# Altium footprint library WR-DSUB_Female.PcbLib: 32 footprints (part 2 of 2)
Each footprint in its own frame and in the unit in brackets; x right, y up, seen from the top. Pads: shape width x height; smd on the part's side, far side on the other; paste and mask are expansions set on the pad; w line width, h text height; cw(c..) or ccw(c..) is an arc to the next point about the centre after c.
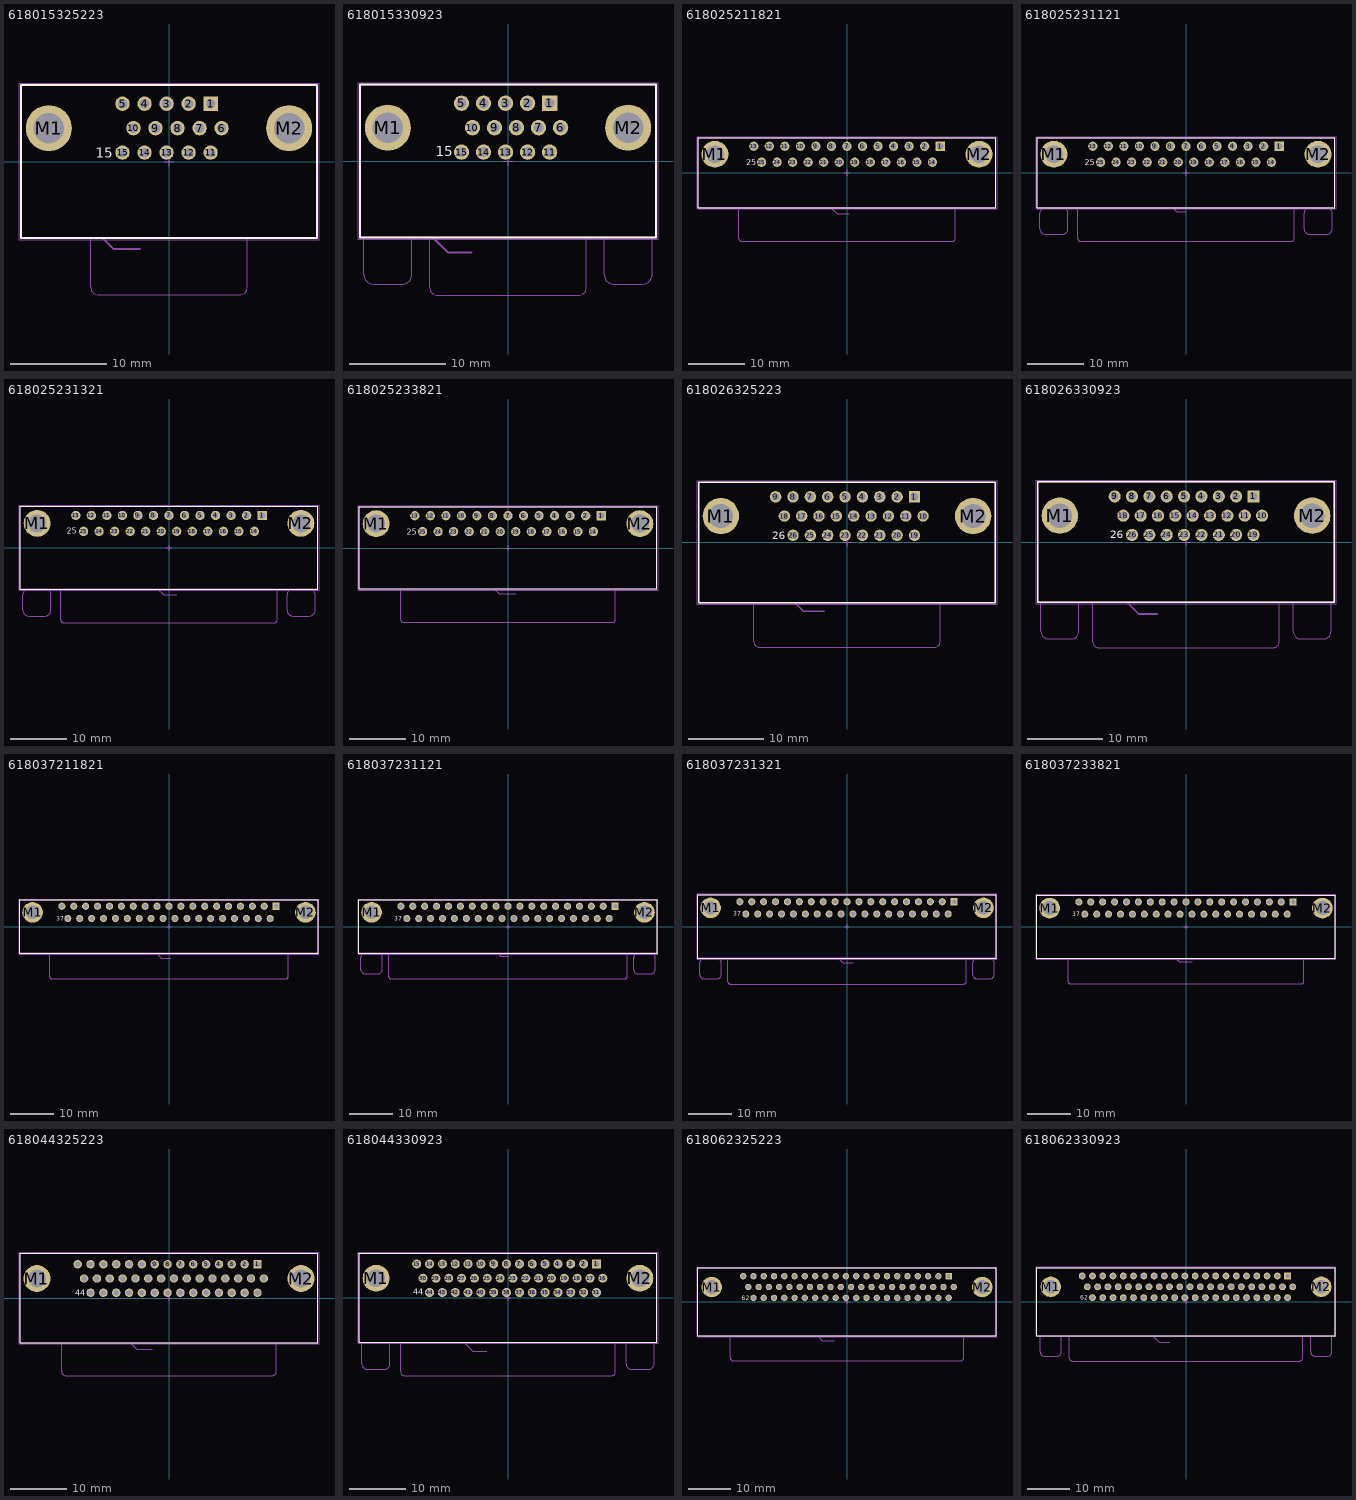
[diagram p1: the footprints below, top view; thin cyan lines are the x and y axes]

## 618015325223 [mm] "15 pins, right angled with Rivet"
height 12.5
pads (17):
  rect 1.5x1.5 hole 1: 1(4.326,6.02)
  round 1.5 hole 1: 2(2.036,6.02) 3(-0.254,6.02) 4(-2.544,6.02) 5(-4.834,6.02) 6(5.466,3.48) 7(3.176,3.48) 8(0.886,3.48) 9(-1.404,3.48) 10(-3.694,3.48) 11(4.326,0.94) 12(2.036,0.94) 13(-0.254,0.94) 14(-2.544,0.94) 15(-4.834,0.94)
  round 4.8 hole 3.2: M1(-12.495,3.48) M2(12.495,3.48)
Top Overlay:
  lines w0.2: -15.4,-7.95 -15.4,7.95 15.4,7.95 15.4,-7.95 -15.4,-7.95
  text "15" at -7.6,0.4 h1.02
Mechanical 2:
  lines w0.2: -15.4,-7.95 15.4,-7.95 ; -6.9,-7.95 -5.75,-9.1 -3,-9.1
  text "PCB Edge" at -2.6,-9.6 h1.02
Mechanical 13:
  lines w0.1: -8.15,-7.95 -8.15,-13.05 ccw(c-7.35,-13.05) -7.35,-13.85 7.35,-13.85 ccw(c7.35,-13.05) 8.15,-13.05 8.15,-7.95 ; -15.4,-7.95 15.4,-7.95 15.4,7.95 -15.4,7.95 -15.4,-7.95
Mechanical 15:
  lines w0.05: -0.5,0 0.5,0 ; 0,-0.5 0,0.5 ; -15.6,-8.15 15.6,-8.15 15.6,8.15 -15.6,8.15 -15.6,-8.15
3D body "618015325223.stp": height 12.55, standoff -3.9, extent -15.402,-13.85 15.402,7.95

## 618015330923 [mm] "15 pins, right angled"
height 12.5
pads (17):
  rect 1.6x1.6 hole 1.05: 1(4.326,6.02)
  round 1.6 hole 1.05: 2(2.036,6.02) 3(-0.254,6.02) 4(-2.544,6.02) 5(-4.834,6.02) 6(5.466,3.48) 7(3.176,3.48) 8(0.886,3.48) 9(-1.404,3.48) 10(-3.694,3.48) 11(4.326,0.94) 12(2.036,0.94) 13(-0.254,0.94) 14(-2.544,0.94) 15(-4.834,0.94)
  round 4.8 hole 3.2: M1(-12.495,3.48) M2(12.495,3.48)
Top Overlay:
  lines w0.2: -15.4,-7.95 -15.4,7.95 15.4,7.95 15.4,-7.95 -15.4,-7.95
  text "15" at -7.5,0.5 h1.02
Mechanical 2:
  lines w0.2: -15.4,-7.95 15.4,-7.95 ; -7.8,-7.95 -6.25,-9.5 -3.8,-9.5
  text "PCB Edge" at -3.4,-10.02 h1.02
Mechanical 13:
  lines w0.1: -15,-7.95 -15,-11.79 ccw(c-14,-11.79) -14,-12.79 -11,-12.79 ccw(c-11,-11.79) -10,-11.79 -10,-7.95 ; -8.15,-7.95 -8.15,-13.15 ccw(c-7.35,-13.15) -7.35,-13.95 7.35,-13.95 ccw(c7.35,-13.15) 8.15,-13.15 8.15,-7.95 ; 10,-7.95 10,-11.79 ccw(c11,-11.79) 11,-12.79 14,-12.79 ccw(c14,-11.79) 15,-11.79 15,-7.95 ; -15.4,-7.95 15.4,-7.95 15.4,7.95 -15.4,7.95 -15.4,-7.95
Mechanical 15:
  lines w0.05: -0.5,0 0.5,0 ; 0,-0.5 0,0.5 ; -15.6,-8.15 -15.6,8.15 15.6,8.15 15.6,-8.15 -15.6,-8.15
3D body "618015330923.stp": height 12.55, standoff -3.95, extent -15.402,-13.95 15.402,7.95

## 618025211821 [mm] "25p 8.08mm bracket, board lock & UNC4-40 Rivet without hex screw"
height 12.5
pads (27):
  rect 1.65x1.65 hole 1.09: 1(16.62,4.72)
  round 1.65 hole 1.09: 2(13.85,4.72) 3(11.08,4.72) 4(8.31,4.72) 5(5.54,4.72) 6(2.77,4.72) 7(0,4.72) 8(-2.77,4.72) 9(-5.54,4.72) 10(-8.31,4.72) 11(-11.08,4.72) 12(-13.85,4.72) 13(-16.62,4.72) 14(15.235,1.88) 15(12.465,1.88) 16(9.695,1.88) 17(6.925,1.88) 18(4.155,1.88) 19(1.385,1.88) 20(-1.385,1.88) 21(-4.155,1.88) 22(-6.925,1.88) 23(-9.695,1.88) 24(-12.465,1.88) 25(-15.235,1.88)
  round 4.8 hole 3.2: M1(-23.55,3.3) M2(23.55,3.3)
Top Overlay:
  lines w0.2: -26.55,-6.2 -26.55,6.2 26.55,6.2 26.55,-6.2 -26.55,-6.2
  text "25" at -17.925,1.35 h1.02
Mechanical 2:
  lines w0.2: -26.55,-6.12 26.55,-6.12 ; -3,-6.12 -1.77,-7.35 0.4,-7.35
  text "PCB Edge" at 0.7,-8.05 h1.02
Mechanical 13:
  lines w0.1: -19.3,-6.2 -19.3,-11.7 ccw(c-18.8,-11.7) -18.8,-12.2 ; -18.85,-12.2 18.8,-12.2 ccw(c18.8,-11.7) 19.3,-11.7 19.3,-6.2 ; -26.55,-6.2 26.55,-6.2 26.55,6.2 -26.55,6.2 -26.55,-6.2
Mechanical 15:
  lines w0.05: -0.5,0 0.5,0 ; 0,-0.5 0,0.5 ; -26.75,-6.4 26.75,-6.4 26.75,6.4 -26.75,6.4 -26.75,-6.4
3D body "618025211821.stp": height 12.55, standoff -3.95, extent -26.55,-12.2 26.55,6.2

## 618025231121 [mm] "25 pins, right angled, 8.08mm, with hex screw"
height 12.5
pads (27):
  rect 1.65x1.65 hole 1.09: 1(16.62,4.72)
  round 1.65 hole 1.09: 2(13.85,4.72) 3(11.08,4.72) 4(8.31,4.72) 5(5.54,4.72) 6(2.77,4.72) 7(0,4.72) 8(-2.77,4.72) 9(-5.54,4.72) 10(-8.31,4.72) 11(-11.08,4.72) 12(-13.85,4.72) 13(-16.62,4.72) 14(15.235,1.88) 15(12.465,1.88) 16(9.695,1.88) 17(6.925,1.88) 18(4.155,1.88) 19(1.385,1.88) 20(-1.385,1.88) 21(-4.155,1.88) 22(-6.925,1.88) 23(-9.695,1.88) 24(-12.465,1.88) 25(-15.235,1.88)
  round 4.8 hole 3.2: M1(-23.55,3.3) M2(23.55,3.3)
Top Overlay:
  lines w0.2: -26.55,-6.2 26.55,-6.2 26.55,6.2 -26.55,6.2 -26.55,-6.2
  text "25" at -18.1,1.35 h1.02
Mechanical 2:
  lines w0.2: -26.55,-6.12 26.55,-6.12 ; -2.5,-6.12 -1.67,-6.95 0,-6.95
  text "PCB Edge" at 0.4,-7.55 h1.02
Mechanical 13:
  lines w0.1: -25.05,-6.2 ccw(c-25.05,-7.2) -26.05,-7.2 -26.05,-10 ccw(c-25.05,-10) -25.05,-11 -22.05,-11 ccw(c-22.05,-10) -21.05,-10 -21.05,-7.2 ccw(c-22.05,-7.2) -22.05,-6.2 ; -19.3,-6.2 -19.3,-11.7 ccw(c-18.8,-11.7) -18.8,-12.2 18.8,-12.2 ccw(c18.8,-11.7) 19.3,-11.7 19.3,-6.2 ; 22.05,-6.2 ccw(c22.05,-7.2) 21.05,-7.2 21.05,-10 ccw(c22.05,-10) 22.05,-11 25.05,-11 ccw(c25.05,-10) 26.05,-10 26.05,-7.2 ccw(c25.05,-7.2) 25.05,-6.2 ; -26.55,-6.2 26.55,-6.2 26.55,6.2 -26.55,6.2 -26.55,-6.2 ; 10.5,-12.2 10.5,-12.2
Mechanical 15:
  lines w0.05: -0.5,0 0.5,0 ; 0,-0.5 0,0.5 ; -26.75,-6.4 -26.75,6.4 26.75,6.4 26.75,-6.4 -26.75,-6.4
3D body "618025231121.stp": height 12.55, standoff -3.95, extent -26.55,-12.2 26.55,6.2

## 618025231321 [mm] "25 pins, right angled, 10.3mm, with hex screw"
height 12.5
pads (27):
  rect 1.65x1.65 hole 1.09: 1(16.62,5.78)
  round 1.65 hole 1.09: 2(13.85,5.78) 3(11.08,5.78) 4(8.31,5.78) 5(5.54,5.78) 6(2.77,5.78) 7(0,5.78) 8(-2.77,5.78) 9(-5.54,5.78) 10(-8.31,5.78) 11(-11.08,5.78) 12(-13.85,5.78) 13(-16.62,5.78) 14(15.235,2.94) 15(12.465,2.94) 16(9.695,2.94) 17(6.925,2.94) 18(4.155,2.94) 19(1.385,2.94) 20(-1.385,2.94) 21(-4.155,2.94) 22(-6.925,2.94) 23(-9.695,2.94) 24(-12.465,2.94) 25(-15.235,2.94)
  round 4.8 hole 3.2: M1(-23.52,4.36) M2(23.52,4.36)
Top Overlay:
  lines w0.2: -26.55,-7.36 -26.55,7.37 26.55,7.37 26.55,-7.36 -26.55,-7.36
  text "25" at -18.2,2.5 h1.02
Mechanical 2:
  lines w0.2: -26.55,-7.26 26.55,-7.26 ; -2.1,-7.26 -0.96,-8.4 1.4,-8.4
  text "PCB Edge" at 1.8,-8.8 h1.02
Mechanical 13:
  lines w0.1: -25.05,-7.36 ccw(c-25.05,-8.36) -26.05,-8.36 -26.05,-11.16 ccw(c-25.05,-11.16) -25.05,-12.16 -22.05,-12.16 ccw(c-22.05,-11.16) -21.05,-11.16 -21.05,-8.36 ccw(c-22.05,-8.36) -22.05,-7.36 ; -19.3,-7.36 -19.3,-12.86 ccw(c-18.8,-12.86) -18.8,-13.36 18.8,-13.36 ; 19.3,-7.36 19.3,-12.86 cw(c18.8,-12.86) 18.8,-13.36 ; 22.05,-7.36 ccw(c22.05,-8.36) 21.05,-8.36 21.05,-11.16 ccw(c22.05,-11.16) 22.05,-12.16 25.05,-12.16 ccw(c25.05,-11.16) 26.05,-11.16 26.05,-8.36 ccw(c25.05,-8.36) 25.05,-7.36 ; 18.8,-13.36 18.8,-13.36 ; -26.55,-7.36 26.55,-7.36 26.55,7.37 -26.55,7.37 -26.55,-7.36
Mechanical 15:
  lines w0.05: -0.5,0 0.5,0 ; 0,-0.5 0,0.5 ; -26.75,-7.59 26.75,-7.59 26.75,7.59 -26.75,7.59 -26.75,-7.59
3D body "618025231321.stp": height 12.57, standoff -3.77, extent -26.535,-13.26 26.535,7.39

## 618025233821 [mm] "25p 10.3mm bracket, board lock & UNC4-40 Rivet without hex screw"
height 12.5
pads (27):
  rect 1.65x1.65 hole 1.09: 1(16.62,5.765)
  round 1.65 hole 1.09: 2(13.85,5.765) 3(11.08,5.765) 4(8.31,5.765) 5(5.54,5.765) 6(2.77,5.765) 7(0,5.765) 8(-2.77,5.765) 9(-5.54,5.765) 10(-8.31,5.765) 11(-11.08,5.765) 12(-13.85,5.765) 13(-16.62,5.765) 14(15.235,2.925) 15(12.465,2.925) 16(9.695,2.925) 17(6.925,2.925) 18(4.155,2.925) 19(1.385,2.925) 20(-1.385,2.925) 21(-4.155,2.925) 22(-6.925,2.925) 23(-9.695,2.925) 24(-12.465,2.925) 25(-15.235,2.925)
  round 4.8 hole 3.2: M1(-23.52,4.345) M2(23.52,4.345)
Top Overlay:
  lines w0.2: -26.55,-7.275 26.55,-7.275 26.55,7.375 -26.55,7.375 -26.55,-7.275
  text "25" at -18.1,2.4 h1.02
Mechanical 2:
  lines w0.2: -26.55,-7.275 26.55,-7.275 ; -2.5,-7.275 -1.575,-8.2 1.4,-8.2
  text "PCB Edge" at 1.8,-8.7 h1.02
Mechanical 13:
  lines w0.1: -19.15,-7.275 -19.15,-12.775 ccw(c-18.65,-12.775) -18.65,-13.275 18.65,-13.275 ; 19.15,-7.275 19.15,-12.775 cw(c18.65,-12.775) 18.65,-13.275 ; 18.65,-13.275 18.65,-13.275 ; -26.55,-7.275 -26.55,7.375 26.55,7.375 26.55,-7.275 -26.55,-7.275
Mechanical 15:
  lines w0.05: -0.5,0 0.5,0 ; 0,-0.5 0,0.5 ; -26.75,-7.575 -26.75,7.575 26.75,7.575 26.75,-7.575 -26.75,-7.575
3D body "618025233821.stp": height 12.57, standoff -3.77, extent -26.535,-13.275 26.535,7.375

## 618026325223 [mm] "26 pins, right angled with Rivet"
height 12.5
pads (28):
  rect 1.5x1.5 hole 1: 1(8.906,6.02)
  round 1.5 hole 1: 2(6.616,6.02) 3(4.326,6.02) 4(2.036,6.02) 5(-0.254,6.02) 6(-2.544,6.02) 7(-4.834,6.02) 8(-7.124,6.02) 9(-9.414,6.02) 10(10.046,3.48) 11(7.756,3.48) 12(5.466,3.48) 13(3.176,3.48) 14(0.886,3.48) 15(-1.404,3.48) 16(-3.694,3.48) 17(-5.984,3.48) 18(-8.274,3.48) 19(8.906,0.94) 20(6.616,0.94) 21(4.326,0.94) 22(2.036,0.94) 23(-0.254,0.94) 24(-2.544,0.94) 25(-4.834,0.94) 26(-7.124,0.94)
  round 4.8 hole 3.2: M1(-16.65,3.48) M2(16.65,3.48)
Top Overlay:
  lines w0.2: -19.6,-7.95 19.6,-7.95 19.6,7.95 -19.6,7.95 -19.6,-7.95
  text "26" at -9.89,0.4 h1.02
Mechanical 2:
  lines w0.2: -19.6,-7.95 19.6,-7.95 ; -6.9,-7.95 -5.75,-9.1 -3,-9.1
  text "PCB Edge" at -2.6,-9.6 h1.02
Mechanical 13:
  lines w0.1: -12.3,-7.95 -12.3,-13.05 ccw(c-11.5,-13.05) -11.5,-13.85 11.5,-13.85 ccw(c11.5,-13.05) 12.3,-13.05 12.3,-7.95 ; -19.6,-7.95 -19.6,7.95 19.6,7.95 19.6,-7.95 -19.6,-7.95
Mechanical 15:
  lines w0.05: -0.5,0 0.5,0 ; 0,-0.5 0,0.5 ; -19.8,-8.15 -19.8,8.15 19.8,8.15 19.8,-8.15 -19.8,-8.15
3D body "618026325223.stp": height 12.55, standoff -3.9, extent -19.598,-13.85 19.613,7.95

## 618026330923 [mm] "26 pins, right angled"
height 12.5
pads (28):
  rect 1.6x1.6 hole 1.05: 1(8.906,6.02)
  round 1.6 hole 1.05: 2(6.616,6.02) 3(4.326,6.02) 4(2.036,6.02) 5(-0.254,6.02) 6(-2.544,6.02) 7(-4.834,6.02) 8(-7.124,6.02) 9(-9.414,6.02) 10(10.046,3.48) 11(7.756,3.48) 12(5.466,3.48) 13(3.176,3.48) 14(0.886,3.48) 15(-1.404,3.48) 16(-3.694,3.48) 17(-5.984,3.48) 18(-8.274,3.48) 19(8.906,0.94) 20(6.616,0.94) 21(4.326,0.94) 22(2.036,0.94) 23(-0.254,0.94) 24(-2.544,0.94) 25(-4.834,0.94) 26(-7.124,0.94)
  round 4.8 hole 3.2: M1(-16.66,3.48) M2(16.66,3.48)
Top Overlay:
  lines w0.2: -19.6,-7.95 19.6,-7.95 19.6,7.95 -19.6,7.95 -19.6,-7.95
  text "26" at -10,0.5 h1.02
Mechanical 2:
  lines w0.2: -19.6,-7.95 19.6,-7.95 ; -7.8,-7.95 -6.25,-9.5 -3.8,-9.5
  text "PCB Edge" at -3.4,-10.02 h1.02
Mechanical 13:
  lines w0.1: -19.15,-7.95 -19.15,-11.79 ccw(c-18.15,-11.79) -18.15,-12.79 -15.15,-12.79 ccw(c-15.15,-11.79) -14.15,-11.79 -14.15,-7.95 ; -12.3,-7.95 -12.3,-13.15 ccw(c-11.5,-13.15) -11.5,-13.95 11.5,-13.95 ccw(c11.5,-13.15) 12.3,-13.15 12.3,-7.95 ; 14.15,-7.95 14.15,-11.79 ccw(c15.15,-11.79) 15.15,-12.79 18.15,-12.79 ccw(c18.15,-11.79) 19.15,-11.79 19.15,-7.95 ; -19.6,-7.95 -19.6,7.95 19.6,7.95 19.6,-7.95 -19.6,-7.95
Mechanical 15:
  lines w0.05: -0.5,0 0.5,0 ; 0,-0.5 0,0.5 ; -19.8,-8.15 -19.8,8.15 19.8,8.15 19.8,-8.15 -19.8,-8.15
3D body "618026330923.stp": height 12.55, standoff -3.9, extent -19.605,-13.85 19.605,7.95

## 618037211821 [mm] "37p 8.08mm bracket, board lock & UNC4-40 Rivet without hex screw"
height 12.5
pads (39):
  rect 1.65x1.65 hole 1.09: 1(24.93,4.72)
  round 1.65 hole 1.09: 2(22.16,4.72) 3(19.39,4.72) 4(16.62,4.72) 5(13.85,4.72) 6(11.08,4.72) 7(8.31,4.72) 8(5.54,4.72) 9(2.77,4.72) 10(0,4.72) 11(-2.77,4.72) 12(-5.54,4.72) 13(-8.31,4.72) 14(-11.08,4.72) 15(-13.85,4.72) 16(-16.62,4.72) 17(-19.39,4.72) 18(-22.16,4.72) 19(-24.93,4.72) 20(23.545,1.88) 21(20.775,1.88) 22(18.005,1.88) 23(15.235,1.88) 24(12.465,1.88) 25(9.695,1.88) 26(6.925,1.88) 27(4.155,1.88) 28(1.385,1.88) 29(-1.385,1.88) 30(-4.155,1.88) 31(-6.925,1.88) 32(-9.695,1.88) 33(-12.465,1.88) 34(-15.235,1.88) 35(-18.005,1.88) 36(-20.775,1.88) 37(-23.545,1.88)
  round 4.8 hole 3.2: M1(-31.75,3.3) M2(31.75,3.3)
Top Overlay:
  lines w0.2: -34.7,-6.2 -34.7,6.2 34.7,6.2 34.7,-6.2 -34.7,-6.2
  text "37" at -26.235,1.35 h1.02
Mechanical 2:
  lines w0.2: -34.7,-6.12 34.7,-6.12 ; -3,-6.12 -1.77,-7.35 0.4,-7.35
  text "PCB Edge" at 0.7,-8.05 h1.02
Mechanical 13:
  lines w0.1: -27.7,-6.2 -27.7,-11.7 ccw(c-27.2,-11.7) -27.2,-12.2 ; -27.25,-12.2 27.2,-12.2 ccw(c27.2,-11.7) 27.7,-11.7 27.7,-6.2 ; -34.7,-6.2 34.7,-6.2 34.7,6.2 -34.7,6.2 -34.7,-6.2
Mechanical 15:
  lines w0.05: -0.5,0 0.5,0 ; 0,-0.5 0,0.5 ; -34.9,-6.4 -34.9,6.4 34.9,6.4 34.9,-6.4 -34.9,-6.4
3D body "618037211821.stp": height 12.55, standoff -3.95, extent -34.7,-12.2 34.7,6.2

## 618037231121 [mm] "37 pins, right angled, 8.08mm, with hex screw"
height 12.5
pads (39):
  rect 1.65x1.65 hole 1.09: 1(24.93,4.72)
  round 1.65 hole 1.09: 2(22.16,4.72) 3(19.39,4.72) 4(16.62,4.72) 5(13.85,4.72) 6(11.08,4.72) 7(8.31,4.72) 8(5.54,4.72) 9(2.77,4.72) 10(0,4.72) 11(-2.77,4.72) 12(-5.54,4.72) 13(-8.31,4.72) 14(-11.08,4.72) 15(-13.85,4.72) 16(-16.62,4.72) 17(-19.39,4.72) 18(-22.16,4.72) 19(-24.93,4.72) 20(23.545,1.88) 21(20.775,1.88) 22(18.005,1.88) 23(15.235,1.88) 24(12.465,1.88) 25(9.695,1.88) 26(6.925,1.88) 27(4.155,1.88) 28(1.385,1.88) 29(-1.385,1.88) 30(-4.155,1.88) 31(-6.925,1.88) 32(-9.695,1.88) 33(-12.465,1.88) 34(-15.235,1.88) 35(-18.005,1.88) 36(-20.775,1.88) 37(-23.545,1.88)
  round 4.8 hole 3.2: M1(-31.75,3.3) M2(31.75,3.3)
Top Overlay:
  lines w0.2: -34.7,-6.2 -34.7,6.2 34.7,6.2 34.7,-6.2 -34.7,-6.2
  text "37" at -26.41,1.35 h1.02
Mechanical 2:
  lines w0.2: -34.7,-6.12 34.7,-6.12 ; -2.5,-6.12 -1.67,-6.95 0,-6.95
  text "PCB Edge" at 0.4,-7.55 h1.02
Mechanical 13:
  lines w0.1: -33.25,-6.2 ccw(c-33.25,-7.2) -34.25,-7.2 -34.25,-10 ccw(c-33.25,-10) -33.25,-11 -30.25,-11 ccw(c-30.25,-10) -29.25,-10 -29.25,-7.2 ccw(c-30.25,-7.2) -30.25,-6.2 ; -27.7,-6.2 -27.7,-11.7 ccw(c-27.2,-11.7) -27.2,-12.2 27.2,-12.2 ccw(c27.2,-11.7) 27.7,-11.7 27.7,-6.2 ; 30.25,-6.2 ccw(c30.25,-7.2) 29.25,-7.2 29.25,-10 ccw(c30.25,-10) 30.25,-11 33.25,-11 ccw(c33.25,-10) 34.25,-10 34.25,-7.2 ccw(c33.25,-7.2) 33.25,-6.2 ; -34.7,-6.2 -34.7,6.25 34.7,6.25 34.7,-6.2 -34.7,-6.2 ; 18.81,-12.2 18.81,-12.2
Mechanical 15:
  lines w0.05: -0.5,0 0.5,0 ; 0,-0.5 0,0.5 ; -34.9,-6.4 34.9,-6.4 34.9,6.4 -34.9,6.4 -34.9,-6.4
3D body "618037231121.stp": height 12.55, standoff -3.95, extent -34.7,-12.15 34.7,6.25

## 618037231321 [mm] "37 pins, right angled, 10.3mm, with hex screw"
height 12.5
pads (39):
  rect 1.65x1.65 hole 1.09: 1(24.93,5.78)
  round 1.65 hole 1.09: 2(22.16,5.78) 3(19.39,5.78) 4(16.62,5.78) 5(13.85,5.78) 6(11.08,5.78) 7(8.31,5.78) 8(5.54,5.78) 9(2.77,5.78) 10(0,5.78) 11(-2.77,5.78) 12(-5.54,5.78) 13(-8.31,5.78) 14(-11.08,5.78) 15(-13.85,5.78) 16(-16.62,5.78) 17(-19.39,5.78) 18(-22.16,5.78) 19(-24.93,5.78) 20(23.545,2.94) 21(20.775,2.94) 22(18.005,2.94) 23(15.235,2.94) 24(12.465,2.94) 25(9.695,2.94) 26(6.925,2.94) 27(4.155,2.94) 28(1.385,2.94) 29(-1.385,2.94) 30(-4.155,2.94) 31(-6.925,2.94) 32(-9.695,2.94) 33(-12.465,2.94) 34(-15.235,2.94) 35(-18.005,2.94) 36(-20.775,2.94) 37(-23.545,2.94)
  round 4.8 hole 3.2: M1(-31.75,4.36) M2(31.75,4.36)
Top Overlay:
  lines w0.2: -34.7,-7.36 -34.7,7.37 34.7,7.37 34.7,-7.36 -34.7,-7.36
  text "37" at -26.51,2.5 h1.02
Mechanical 2:
  lines w0.2: -34.7,-7.26 34.7,-7.26 ; -2.1,-7.26 -0.96,-8.4 1.4,-8.4
  text "PCB Edge" at 1.8,-8.8 h1.02
Mechanical 13:
  lines w0.1: -33.25,-7.36 ccw(c-33.25,-8.36) -34.25,-8.36 -34.25,-11.16 ccw(c-33.25,-11.16) -33.25,-12.16 -30.25,-12.16 ccw(c-30.25,-11.16) -29.25,-11.16 -29.25,-8.36 ccw(c-30.25,-8.36) -30.25,-7.36 ; -27.7,-7.36 -27.7,-12.86 ccw(c-27.2,-12.86) -27.2,-13.36 27.2,-13.36 ; 27.7,-7.36 27.7,-12.86 cw(c27.2,-12.86) 27.2,-13.36 ; 30.25,-7.36 ccw(c30.25,-8.36) 29.25,-8.36 29.25,-11.16 ccw(c30.25,-11.16) 30.25,-12.16 33.25,-12.16 ccw(c33.25,-11.16) 34.25,-11.16 34.25,-8.36 ccw(c33.25,-8.36) 33.25,-7.36 ; 27.2,-13.36 27.2,-13.36 ; -34.7,-7.36 34.7,-7.36 34.7,7.37 -34.7,7.37 -34.7,-7.36
Mechanical 15:
  lines w0.05: -0.5,0 0.5,0 ; 0,-0.5 0,0.5 ; -34.9,-7.59 34.9,-7.59 34.9,7.59 -34.9,7.59 -34.9,-7.59
3D body "618037231321.stp": height 12.57, standoff -3.77, extent -34.66,-13.28 34.66,7.37

## 618037233821 [mm] "37p 10.3mm bracket, board lock & UNC4-40 Rivet without hex screw"
height 12.5
pads (39):
  rect 1.65x1.65 hole 1.09: 1(24.93,5.765)
  round 1.65 hole 1.09: 2(22.16,5.765) 3(19.39,5.765) 4(16.62,5.765) 5(13.85,5.765) 6(11.08,5.765) 7(8.31,5.765) 8(5.54,5.765) 9(2.77,5.765) 10(0,5.765) 11(-2.77,5.765) 12(-5.54,5.765) 13(-8.31,5.765) 14(-11.08,5.765) 15(-13.85,5.765) 16(-16.62,5.765) 17(-19.39,5.765) 18(-22.16,5.765) 19(-24.93,5.765) 20(23.545,2.925) 21(20.775,2.925) 22(18.005,2.925) 23(15.235,2.925) 24(12.465,2.925) 25(9.695,2.925) 26(6.925,2.925) 27(4.155,2.925) 28(1.385,2.925) 29(-1.385,2.925) 30(-4.155,2.925) 31(-6.925,2.925) 32(-9.695,2.925) 33(-12.465,2.925) 34(-15.235,2.925) 35(-18.005,2.925) 36(-20.775,2.925) 37(-23.545,2.925)
  round 4.8 hole 3.2: M1(-31.75,4.345) M2(31.75,4.345)
Top Overlay:
  lines w0.2: -34.7,-7.275 -34.7,7.375 34.7,7.375 34.7,-7.275 -34.7,-7.275
  text "37" at -26.41,2.4 h1.02
Mechanical 2:
  lines w0.2: -34.7,-7.275 34.7,-7.275 ; -2.5,-7.275 -1.575,-8.2 1.4,-8.2
  text "PCB Edge" at 1.8,-8.7 h1.02
Mechanical 13:
  lines w0.1: -27.4,-7.275 -27.4,-12.775 ccw(c-26.9,-12.775) -26.9,-13.275 26.9,-13.275 ; 27.4,-7.275 27.4,-12.775 cw(c26.9,-12.775) 26.9,-13.275 ; 26.9,-13.275 26.9,-13.275 ; -34.7,-7.275 34.7,-7.275 34.7,7.375 -34.7,7.375 -34.7,-7.275
Mechanical 15:
  lines w0.05: -0.5,0 0.5,0 ; 0,-0.5 0,0.5 ; -34.9,-7.575 34.9,-7.575 34.9,7.575 -34.9,7.575 -34.9,-7.575
3D body "618037233821.stp": height 12.57, standoff -3.77, extent -34.66,-13.275 34.66,7.375

## 618044325223 [mm] "44 pins, right angled with Rivet"
height 12.5
pads (46):
  rect 1.5x1.5 hole 1: 1(15.776,6.02)
  round 1.5 hole 1: 2(13.486,6.02) 3(11.196,6.02) 4(8.906,6.02) 5(6.616,6.02) 6(4.326,6.02) 7(2.036,6.02) 8(-0.254,6.02) 9(-2.544,6.02) 10(-4.834,6.02) 11(-7.124,6.02) 12(-9.414,6.02) 13(-11.704,6.02) 14(-13.994,6.02) 15(-16.284,6.02) 16(16.916,3.48) 17(14.626,3.48) 18(12.336,3.48) 19(10.046,3.48) 20(7.756,3.48) 21(5.466,3.48) 22(3.176,3.48) 23(0.886,3.48) 24(-1.404,3.48) 25(-3.694,3.48) 26(-5.984,3.48) 27(-8.274,3.48) 28(-10.564,3.48) 29(-12.854,3.48) 30(-15.144,3.48) 31(15.776,0.94) 32(13.486,0.94) 33(11.196,0.94) 34(8.906,0.94) 35(6.616,0.94) 36(4.326,0.94) 37(2.036,0.94) 38(-0.254,0.94) 39(-2.544,0.94) 40(-4.834,0.94) 41(-7.124,0.94) 42(-9.414,0.94) 43(-11.704,0.94) 44(-13.994,0.94)
  round 4.8 hole 3.2: M1(-23.55,3.48) M2(23.55,3.48)
Top Overlay:
  lines w0.2: -26.55,-7.95 -26.55,7.95 26.55,7.95 26.55,-7.95 -26.55,-7.95
  text "44" at -16.76,0.4 h1.02
Mechanical 2:
  lines w0.2: -26.55,-7.95 26.55,-7.95 ; -6.9,-7.95 -5.75,-9.1 -3,-9.1
  text "PCB Edge" at -2.6,-9.6 h1.02
Mechanical 13:
  lines w0.1: -19.15,-7.95 -19.15,-13.05 ccw(c-18.35,-13.05) -18.35,-13.85 18.35,-13.85 ccw(c18.35,-13.05) 19.15,-13.05 19.15,-7.95 ; -26.55,-7.95 26.55,-7.95 26.55,7.95 -26.55,7.95 -26.55,-7.95
Mechanical 15:
  lines w0.05: -0.5,0 0.5,0 ; 0,-0.5 0,0.5 ; -26.75,-8.15 -26.75,8.15 26.75,8.15 26.75,-8.15 -26.75,-8.15
3D body "618044325223.stp": height 12.55, standoff -3.9, extent -26.578,-13.85 26.553,7.95

## 618044330923 [mm] "44 pins, right angled"
height 12.5
pads (46):
  rect 1.6x1.6 hole 1.05: 1(15.776,6.02)
  round 1.6 hole 1.05: 2(13.486,6.02) 3(11.196,6.02) 4(8.906,6.02) 5(6.616,6.02) 6(4.326,6.02) 7(2.036,6.02) 8(-0.254,6.02) 9(-2.544,6.02) 10(-4.834,6.02) 11(-7.124,6.02) 12(-9.414,6.02) 13(-11.704,6.02) 14(-13.994,6.02) 15(-16.284,6.02) 16(16.916,3.48) 17(14.626,3.48) 18(12.336,3.48) 19(10.046,3.48) 20(7.756,3.48) 21(5.466,3.48) 22(3.176,3.48) 23(0.886,3.48) 24(-1.404,3.48) 25(-3.694,3.48) 26(-5.984,3.48) 27(-8.274,3.48) 28(-10.564,3.48) 29(-12.854,3.48) 30(-15.144,3.48) 31(15.776,0.94) 32(13.486,0.94) 33(11.196,0.94) 34(8.906,0.94) 35(6.616,0.94) 36(4.326,0.94) 37(2.036,0.94) 38(-0.254,0.94) 39(-2.544,0.94) 40(-4.834,0.94) 41(-7.124,0.94) 42(-9.414,0.94) 43(-11.704,0.94) 44(-13.994,0.94)
  round 4.8 hole 3.2: M1(-23.52,3.48) M2(23.52,3.48)
Top Overlay:
  lines w0.2: -26.55,-7.95 26.55,-7.95 26.55,7.95 -26.55,7.95 -26.55,-7.95
  text "44" at -16.87,0.5 h1.02
Mechanical 2:
  lines w0.2: -26.55,-7.95 26.55,-7.95 ; -7.8,-7.95 -6.25,-9.5 -3.8,-9.5
  text "PCB Edge" at -3.4,-10.02 h1.02
Mechanical 13:
  lines w0.1: -26.05,-7.95 -26.05,-11.79 ccw(c-25.05,-11.79) -25.05,-12.79 -22.05,-12.79 ccw(c-22.05,-11.79) -21.05,-11.79 -21.05,-7.95 ; -19.15,-7.95 -19.15,-13.15 ccw(c-18.35,-13.15) -18.35,-13.95 18.32,-13.95 ; 18.35,-13.95 ccw(c18.35,-13.15) 19.15,-13.15 19.15,-7.95 ; 21.05,-7.95 21.05,-11.79 ccw(c22.05,-11.79) 22.05,-12.79 25.05,-12.79 ccw(c25.05,-11.79) 26.05,-11.79 26.05,-7.95 ; -26.55,-7.95 -26.55,7.95 26.55,7.95 26.55,-7.95 -26.55,-7.95
Mechanical 15:
  lines w0.05: -0.5,0 0.5,0 ; 0,-0.5 0,0.5 ; -26.75,-8.15 -26.75,8.15 26.75,8.15 26.75,-8.15 -26.75,-8.15
3D body "618044330923.stp": height 12.55, standoff -3.9, extent -26.565,-13.85 26.565,7.95

## 618062325223 [mm] "62 pins, right angled with Rivet"
height 12.5
pads (64):
  rect 1.5x1.5 hole 1: 1(23.846,6.02)
  round 1.5 hole 1: 2(21.436,6.02) 3(19.026,6.02) 4(16.616,6.02) 5(14.206,6.02) 6(11.796,6.02) 7(9.386,6.02) 8(6.976,6.02) 9(4.566,6.02) 10(2.156,6.02) 11(-0.254,6.02) 12(-2.664,6.02) 13(-5.074,6.02) 14(-7.484,6.02) 15(-9.894,6.02) 16(-12.304,6.02) 17(-14.714,6.02) 18(-17.124,6.02) 19(-19.534,6.02) 20(-21.944,6.02) 21(-24.354,6.02) 22(25.046,3.48) 23(22.636,3.48) 24(20.226,3.48) 25(17.816,3.48) 26(15.406,3.48) 27(12.996,3.48) 28(10.586,3.48) 29(8.176,3.48) 30(5.766,3.48) 31(3.356,3.48) 32(0.946,3.48) 33(-1.464,3.48) 34(-3.874,3.48) 35(-6.284,3.48) 36(-8.694,3.48) 37(-11.104,3.48) 38(-13.514,3.48) 39(-15.924,3.48) 40(-18.334,3.48) 41(-20.744,3.48) 42(-23.154,3.48) 43(23.846,0.94) 44(21.436,0.94) 45(19.026,0.94) 46(16.616,0.94) 47(14.206,0.94) 48(11.796,0.94) 49(9.386,0.94) 50(6.976,0.94) 51(4.566,0.94) 52(2.156,0.94) 53(-0.254,0.94) 54(-2.664,0.94) 55(-5.074,0.94) 56(-7.484,0.94) 57(-9.894,0.94) 58(-12.304,0.94) 59(-14.714,0.94) 60(-17.124,0.94) 61(-19.534,0.94) 62(-21.944,0.94)
  round 4.8 hole 3.2: M1(-31.75,3.48) M2(31.75,3.48)
Top Overlay:
  lines w0.2: -35,-7.95 -35,7.95 35,7.95 35,-7.95 -35,-7.95
  text "62" at -24.71,0.4 h1.02
Mechanical 2:
  lines w0.2: -34.7,-7.95 34.7,-7.95 ; -6.9,-7.95 -5.75,-9.1 -3,-9.1
  text "PCB Edge" at -2.6,-9.6 h1.02
Mechanical 13:
  lines w0.1: -35,7.95 35,7.95 35,-7.95 -34.997,-7.95 -34.997,7.95 ; -27.4,-7.95 -27.4,-13.05 ccw(c-26.6,-13.05) -26.6,-13.85 26.6,-13.85 ccw(c26.6,-13.05) 27.4,-13.05 27.4,-7.95
Mechanical 15:
  lines w0.05: -0.5,0 0.5,0 ; 0,-0.5 0,0.5 ; -35.2,-8.15 -35.2,8.15 35.2,8.15 35.2,-8.15 -35.2,-8.15
3D body "618062325223.stp": height 12.55, standoff -3.9, extent -34.997,-13.85 35.003,7.95

## 618062330923 [mm] "62 pins, right angled"
height 12.5
pads (64):
  rect 1.6x1.6 hole 1.05: 1(23.846,6.02)
  round 1.6 hole 1.05: 2(21.436,6.02) 3(19.026,6.02) 4(16.616,6.02) 5(14.206,6.02) 6(11.796,6.02) 7(9.386,6.02) 8(6.976,6.02) 9(4.566,6.02) 10(2.156,6.02) 11(-0.254,6.02) 12(-2.664,6.02) 13(-5.074,6.02) 14(-7.484,6.02) 15(-9.894,6.02) 16(-12.304,6.02) 17(-14.714,6.02) 18(-17.124,6.02) 19(-19.534,6.02) 20(-21.944,6.02) 21(-24.354,6.02) 22(25.046,3.48) 23(22.636,3.48) 24(20.226,3.48) 25(17.816,3.48) 26(15.406,3.48) 27(12.996,3.48) 28(10.586,3.48) 29(8.176,3.48) 30(5.766,3.48) 31(3.356,3.48) 32(0.946,3.48) 33(-1.464,3.48) 34(-3.874,3.48) 35(-6.284,3.48) 36(-8.694,3.48) 37(-11.104,3.48) 38(-13.514,3.48) 39(-15.924,3.48) 40(-18.334,3.48) 41(-20.744,3.48) 42(-23.154,3.48) 43(23.846,0.94) 44(21.436,0.94) 45(19.026,0.94) 46(16.616,0.94) 47(14.206,0.94) 48(11.796,0.94) 49(9.386,0.94) 50(6.976,0.94) 51(4.566,0.94) 52(2.156,0.94) 53(-0.254,0.94) 54(-2.664,0.94) 55(-5.074,0.94) 56(-7.484,0.94) 57(-9.894,0.94) 58(-12.304,0.94) 59(-14.714,0.94) 60(-17.124,0.94) 61(-19.534,0.94) 62(-21.944,0.94)
  round 4.8 hole 3.2: M1(-31.75,3.48) M2(31.75,3.48)
Top Overlay:
  lines w0.2: -35,-7.95 -35,7.95 35,7.95 35,-7.95 -35,-7.95
  text "62" at -24.82,0.5 h1.02
Mechanical 2:
  lines w0.2: -34.7,-7.95 34.7,-7.95 ; -7.8,-7.95 -6.25,-9.5 -3.8,-9.5
  text "PCB Edge" at -3.4,-10.02 h1.02
Mechanical 13:
  lines w0.1: -34.25,-7.95 -34.25,-11.79 ccw(c-33.25,-11.79) -33.25,-12.79 -30.25,-12.79 ccw(c-30.25,-11.79) -29.25,-11.79 -29.25,-7.95 ; -27.4,-7.95 -27.4,-13.15 ccw(c-26.6,-13.15) -26.6,-13.95 26.6,-13.95 ccw(c26.6,-13.15) 27.4,-13.15 27.4,-7.95 ; 29.25,-7.95 29.25,-11.79 ccw(c30.25,-11.79) 30.25,-12.79 33.25,-12.79 ccw(c33.25,-11.79) 34.25,-11.79 34.25,-7.95 ; -35,-7.95 35,-7.95 35,7.95 -35,7.95 -35,-7.95
Mechanical 15:
  lines w0.05: -0.5,0 0.5,0 ; 0,-0.5 0,0.5 ; -35.2,-8.15 -35.2,8.15 35.2,8.15 35.2,-8.15 -35.2,-8.15
3D body "618062330923.stp": height 12.55, standoff -3.9, extent -35,-13.85 35,7.95